# Altium footprint library PCB_GENERAL.PcbLib: 226 footprints (part 6 of 15)
Each footprint in its own frame and in the unit in brackets; x right, y up, seen from the top. Pads: shape width x height; smd on the part's side, far side on the other; paste and mask are expansions set on the pad; w line width, h text height; cw(c..) or ccw(c..) is an arc to the next point about the centre after c.
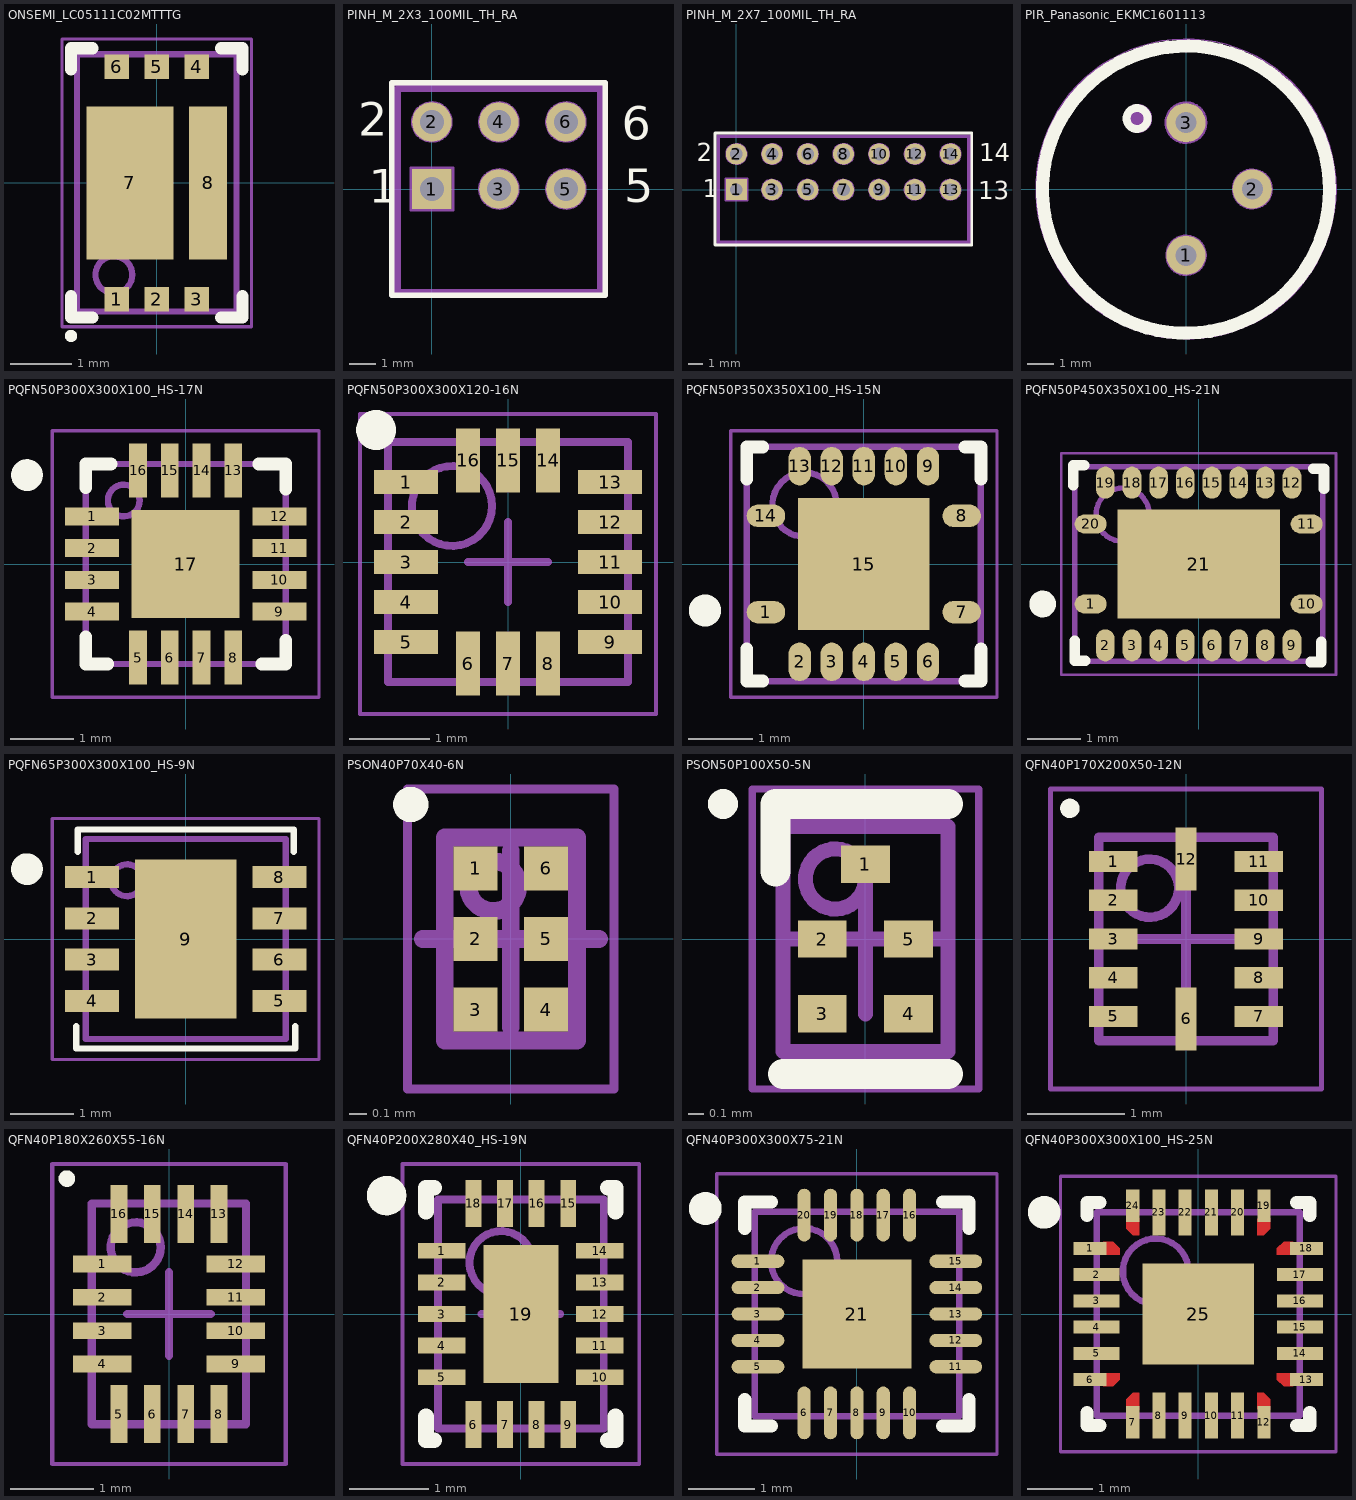
[diagram p5: the footprints below, top view; thin cyan lines are the x and y axes]

## ONSEMI_LC05111C02MTTTG [mm]
height 0.8
pads (8):
  rect 0.4x0.4 smd: 1(-0.65,-1.9) 2(0,-1.9) 3(0.65,-1.9) 4(0.65,1.9) 5(0,1.9) 6(-0.65,1.9)
  rect 1.42x2.5 smd: 7(-0.44,0)
  rect 0.62x2.5 smd: 8(0.84,0)
Top Overlay:
  circle w0.1: c-1.4,-2.5 r0.05
  lines w0.2: -1.4,-1.85 -1.4,-2.2 -1.05,-2.2 ; -1.4,1.85 -1.4,2.2 -1.05,2.2 ; 1.05,-2.2 1.4,-2.2 1.4,-1.85 ; 1.05,2.2 1.4,2.2 1.4,1.85
Mechanical 11:
  text ".Designator" at -0.75,-0.275 h1
Mechanical 14:
  circle w0.1: c-0.7,-1.5 r0.3
  lines w0.1: -1.3,-2.1 1.3,-2.1 1.3,2.1 -1.3,2.1 -1.3,-2.1
Mechanical 15:
  lines w0.05: -0.25,0 0.25,0 ; 0,-0.25 0,0.25 ; -1.55,-2.35 1.55,-2.35 1.55,2.35 -1.55,2.35 -1.55,-2.35
3D body: height 0.8, standoff 0.05, extent -1.3,-2.1 1.3,2.1

## PINH_M_2X3_100MIL_TH_RA [mm] "Connector; Header; Right Angle, 2x3 Position"
height 8
pads (6):
  rect 1.5x1.5 hole 0.9: 1(0,0)
  round 1.5 hole 0.9: 2(0,2.54) 3(2.54,0) 4(2.54,2.54) 5(5.08,0) 6(5.08,2.54)
Top Overlay:
  lines w0.2: -1.525,-4.025 6.575,-4.025 6.575,4.025 -1.525,4.025 -1.525,-4.025
  text "6" at 7.2,1.875 h1.27
  text "5" at 7.3,-0.5 h1.27
  text "1" at -2.4,-0.525 h1.27
  text "2" at -2.8,2.025 h1.27
Mechanical 11:
  text ".Designator" at -1.1,4.825 h1
Mechanical 14:
  circle w0.1: c5.08,0 r0.738
  circle w0.1: c2.54,0 r0.738
  circle w0.1: c5.08,2.54 r0.738
  circle w0.1: c0,2.54 r0.738
  circle w0.1: c2.54,2.54 r0.738
  lines w0.1: -0.8,-0.8 -0.8,0.8 0.8,0.8 0.8,-0.8 -0.8,-0.8
  lines w0.254: -1.3,-3.925 -1.3,3.8 6.38,3.8 6.38,-3.925 -1.3,-3.925
Mechanical 15:
  lines w0.05: -1.45,-4 -1.45,3.925 6.475,3.925 6.475,-4 -1.45,-4
3D body "12544.stp": height 5.5, standoff -3.25, extent -1.36,-9.6 6.26,2.855

## PINH_M_2X7_100MIL_TH_RA [mm] "Connector; Header; Right Angle; 2x7 Position"
height 8
pads (14):
  rect 1.5x1.5 hole 0.9: 1(0,0)
  round 1.5 hole 0.9: 2(0,2.54) 3(2.54,0) 4(2.54,2.54) 5(5.08,0) 6(5.08,2.54) 7(7.62,0) 8(7.62,2.54) 9(10.16,0) 10(10.16,2.54) 11(12.7,0) 12(12.7,2.54) 13(15.24,0) 14(15.24,2.54)
Top Overlay:
  lines w0.2: -1.525,-3.925 16.75,-3.925 16.75,4.025 -1.525,4.025 -1.525,-3.925
  text "14" at 17.275,2.025 h1.27
  text "13" at 17.225,-0.675 h1.27
  text "1" at -2.4,-0.525 h1.27
  text "2" at -2.8,2.025 h1.27
Mechanical 11:
  text ".Designator" at -1.1,4.825 h1
Mechanical 14:
  circle w0.1: c15.235,2.54 r0.738
  circle w0.1: c15.235,0 r0.738
  circle w0.1: c12.695,0 r0.738
  circle w0.1: c12.695,2.54 r0.738
  circle w0.1: c10.155,2.54 r0.738
  circle w0.1: c10.155,0 r0.738
  circle w0.1: c5.08,0 r0.738
  circle w0.1: c2.54,0 r0.738
  circle w0.1: c7.62,0 r0.738
  circle w0.1: c7.62,2.54 r0.738
  circle w0.1: c5.08,2.54 r0.738
  circle w0.1: c0,2.54 r0.738
  circle w0.1: c2.54,2.54 r0.738
  lines w0.1: -0.8,-0.8 -0.8,0.8 0.8,0.8 0.8,-0.8 -0.8,-0.8
  lines w0.254: -1.3,-3.725 -1.3,3.8 16.54,3.8 16.54,-3.725 -1.3,-3.725
Mechanical 15:
  lines w0.05: -1.45,-3.825 -1.45,3.925 16.7,3.925 16.7,-3.825 -1.45,-3.825
3D body "826662-7.stp": height 5.5, standoff -3.25, extent -1.29,-9.575 16.49,2.88

## PIR_Panasonic_EKMC1601113 [mm] "Passive InfraLED Motion Sensor"
height 14.4
pads (3):
  round 1.5 hole 0.8: 1(0,-2.54) 2(2.54,0) 3(0,2.54)
Top Overlay:
  circle w0.3: c-1.875,2.7 r0.401
  circle w0.5: c0,-0.025 r5.5
Mechanical 11:
  text ".Designator" at -4.325,6.675 h1
Mechanical 14:
  circle w0.1: c0,-2.54 r0.747
  circle w0.1: c2.54,0 r0.74
  circle w0.1: c0,2.54 r0.772
  circle w1: c-1.85,2.7 r0.05
  circle w0.1: c0,0 r5.5
Mechanical 15:
  circle w0.05: c0,0 r5.745
3D body: height 14.4, standoff 0, extent -5.468,-5.498 5.525,5.498

## PQFN50P300X300X100_HS-17N [mm] "PQFN, 16-Leads, Body 3,00x3,00mm, Pitch 0,50mm, Thermal Pad 1,60x2,50mm, IPC Medium Density"
height 1
pads (17):
  rect 0.85x0.28 smd: 1(-1.475,0.75) 2(-1.475,0.25) 3(-1.475,-0.25) 4(-1.475,-0.75) 9(1.475,-0.75) 10(1.475,-0.25) 11(1.475,0.25) 12(1.475,0.75)
  rect 0.28x0.85 smd: 5(-0.75,-1.475) 6(-0.25,-1.475) 7(0.25,-1.475) 8(0.75,-1.475) 13(0.75,1.475) 14(0.25,1.475) 15(-0.25,1.475) 16(-0.75,1.475)
  rect 1.7x1.7 smd: 17(0,0)
Top Overlay:
  circle w0.25: c-2.5,1.4 r0.125
  lines w0.2: -1.575,-1.15 -1.575,-1.575 -1.225,-1.575 ; -1.575,1.2 -1.575,1.575 -1.175,1.575 ; 1.15,1.575 1.575,1.575 1.575,1.175 ; 1.2,-1.575 1.575,-1.575 1.575,-1.2
Mechanical 11:
  text ".Designator" at -2.175,2.275 h1
Mechanical 14:
  circle w0.1: c-0.975,1 r0.25
  lines w0.1: -1.575,-1.575 1.575,-1.575 1.575,1.575 -1.575,1.575 -1.575,-1.575
Mechanical 15:
  lines w0.05: -2.1,-2.1 2.1,-2.1 2.1,2.1 -2.1,2.1 -2.1,-2.1
  lines w0.1: -0.5,0 0.5,0 ; 0,-0.5 0,0.5
3D body "User Library-QFN-16.step": height 0.9, standoff 0, extent -1.501,-1.501 1.501,1.501

## PQFN50P300X300X120-16N [mm] "PQFN, 16-Leads, Body 3,00x3,00mm, Pitch 0,50mm, IPC Medium Density"
height 1.2
pads (16):
  rect 0.8x0.3 smd: 1(-1.275,1) 2(-1.275,0.5) 3(-1.275,0) 4(-1.275,-0.5) 5(-1.275,-1) 9(1.275,-1) 10(1.275,-0.5) 11(1.275,0) 12(1.275,0.5) 13(1.275,1)
  rect 0.3x0.8 smd: 6(-0.5,-1.27) 7(0,-1.27) 8(0.5,-1.27) 14(0.5,1.27) 15(0,1.27) 16(-0.5,1.27)
Top Overlay:
  circle w0.25: c-1.65,1.65 r0.125
Mechanical 11:
  text ".Designator" at -0.875,-0.25 h1
Mechanical 14:
  circle w0.1: c-0.7,0.7 r0.5
  lines w0.1: -1.5,-1.5 -1.5,1.5 1.5,1.5 1.5,-1.5 -1.5,-1.5
Mechanical 15:
  lines w0.05: -1.85,-1.9 -1.85,1.85 1.85,1.85 1.85,-1.9 -1.85,-1.9
  lines w0.1: -0.5,0 0.5,0 ; 0,-0.5 0,0.5
3D body "PQFN50P300X300X120-16N.step": height 1.2, standoff 0, extent -1.55,-1.55 1.55,1.55

## PQFN50P350X350X100_HS-15N [mm] "PQFN, 14-Leads, Body 3,50x3,50mm, Pitch 0,50mm/1,50mm, Thermal Pad 2,05x2,05mm, IPC Medium Density"
height 1
pads (15):
  oval 0.6x0.35 smd: 1(-1.525,-0.75) 7(1.525,-0.75) 8(1.525,0.75) 14(-1.525,0.75)
  oval 0.35x0.6 smd: 2(-1,-1.525) 3(-0.5,-1.525) 4(0,-1.525) 5(0.5,-1.525) 6(1,-1.525) 9(1,1.525) 10(0.5,1.525) 11(0,1.525) 12(-0.5,1.525) 13(-1,1.525)
  rect 2.05x2.05 smd: 15(0,0)
Top Overlay:
  circle w0.25: c-2.475,-0.725 r0.125
  lines w0.2: -1.825,-1.325 -1.825,-1.825 -1.575,-1.825 ; -1.825,1.325 -1.825,1.825 -1.575,1.825 ; 1.575,-1.825 1.825,-1.825 1.825,-1.325 ; 1.575,1.825 1.825,1.825 1.825,1.325
Mechanical 11:
  text ".Designator" at -3.125,2.5 h1
Mechanical 14:
  circle w0.1: c-0.925,0.925 r0.5
  lines w0.1: -1.825,-1.825 -1.825,1.825 1.825,1.825 1.825,-1.825 -1.825,-1.825
Mechanical 15:
  lines w0.05: -2.075,-2.075 -2.075,2.075 2.075,2.075 2.075,-2.075 -2.075,-2.075
  lines w0.1: -0.5,0 0.5,0 ; 0,-0.5 0,0.5
3D body: height 1, standoff 0, extent -1.825,-1.825 1.825,1.825

## PQFN50P450X350X100_HS-21N [mm] "PQFN, 20-Leads, Body 4,50x3,50mm, Pitch 0,50mm/1,50mm, Thermal Pad 3,05x2,05mm, IPC Medium Density"
height 1
pads (21):
  oval 0.6x0.35 smd: 1(-2.025,-0.75) 10(2.025,-0.75) 11(2.025,0.75) 20(-2.025,0.75)
  oval 0.35x0.6 smd: 2(-1.75,-1.525) 3(-1.25,-1.525) 4(-0.75,-1.525) 5(-0.25,-1.525) 6(0.25,-1.525) 7(0.75,-1.525) 8(1.25,-1.525) 9(1.75,-1.525) 12(1.75,1.525) 13(1.25,1.525) 14(0.75,1.525) 15(0.25,1.525) 16(-0.25,1.525) 17(-0.75,1.525) 18(-1.25,1.525) 19(-1.75,1.525)
  rect 3.05x2.05 smd: 21(0,0)
Top Overlay:
  circle w0.25: c-2.925,-0.75 r0.125
  lines w0.2: -2.35,1.475 -2.35,1.85 -2.15,1.85 ; -2.325,-1.438 -2.325,-1.812 -2.125,-1.812 ; 2.1,-1.837 2.3,-1.837 2.3,-1.462 ; 2.15,1.787 2.35,1.787 2.35,1.412
Mechanical 11:
  text ".Designator" at -3.025,2.725 h1
Mechanical 14:
  circle w0.1: c-1.425,0.925 r0.5
  lines w0.1: -2.325,-1.825 -2.325,1.825 2.325,1.825 2.325,-1.825 -2.325,-1.825
Mechanical 15:
  lines w0.05: -2.575,-2.075 -2.575,2.075 2.575,2.075 2.575,-2.075 -2.575,-2.075
  lines w0.1: -0.5,0 0.5,0 ; 0,-0.5 0,0.5
3D body: height 1, standoff 0, extent -2.325,-1.825 2.325,1.825

## PQFN65P300X300X100_HS-9N [mm] "PQFN, 8-Leads, Body 3,00x3,00mm, Pitch 0,65mm, Thermal Pad 1,60x2,50mm, IPC Medium Density"
height 1
pads (9):
  rect 0.85x0.35 smd: 1(-1.475,0.975) 2(-1.475,0.325) 3(-1.475,-0.325) 4(-1.475,-0.975) 5(1.475,-0.975) 6(1.475,-0.325) 7(1.475,0.325) 8(1.475,0.975)
  rect 1.6x2.5 smd: 9(0,0)
Top Overlay:
  circle w0.25: c-2.5,1.1 r0.125
  lines w0.1: -1.725,-1.375 -1.725,-1.725 1.725,-1.725 1.725,-1.375 ; -1.7,1.375 -1.7,1.725 1.7,1.725 1.7,1.375
Mechanical 11:
  text ".Designator" at -1.4,2.25 h1
Mechanical 14:
  circle w0.1: c-0.925,0.925 r0.25
  lines w0.1: -1.575,-1.575 -1.575,1.575 1.575,1.575 1.575,-1.575 -1.575,-1.575
Mechanical 15:
  lines w0.05: -2.1,-1.9 -2.1,1.9 2.1,1.9 2.1,-1.9 -2.1,-1.9
  lines w0.1: -0.5,0 0.5,0 ; 0,-0.5 0,0.5
3D body: height 1, standoff 0, extent -1.575,-1.575 1.575,1.575

## PSON40P70X40-6N [mm] "PSON, 6-Leads, Body 1,10x0,70mm, Pitch 0,40mm, IPC Medium Density"
height 0.4
pads (6):
  rect 0.25x0.25 smd paste-1: 1(-0.2,0.4) 2(-0.2,0) 3(-0.2,-0.4) 4(0.2,-0.4) 5(0.2,0) 6(0.2,0.4)
Top Overlay:
  circle w0.1: c-0.567,0.762 r0.05
Top Paste:
  region: -0.325,-0.4 -0.325,-0.425 -0.306,-0.471 -0.271,-0.506 -0.225,-0.525 -0.2,-0.525 -0.175,-0.525 -0.129,-0.506 -0.094,-0.471 -0.075,-0.425 -0.075,-0.4 -0.075,-0.375 -0.094,-0.329 -0.129,-0.294 -0.175,-0.275 -0.2,-0.275 -0.225,-0.275 -0.271,-0.294 -0.306,-0.329 -0.325,-0.375
  region: 0.075,-0.4 0.075,-0.425 0.094,-0.471 0.129,-0.506 0.175,-0.525 0.2,-0.525 0.225,-0.525 0.271,-0.506 0.306,-0.471 0.325,-0.425 0.325,-0.4 0.325,-0.375 0.306,-0.329 0.271,-0.294 0.225,-0.275 0.2,-0.275 0.175,-0.275 0.129,-0.294 0.094,-0.329 0.075,-0.375
  region: 0.075,0 0.075,-0.025 0.094,-0.071 0.129,-0.106 0.175,-0.125 0.2,-0.125 0.225,-0.125 0.271,-0.106 0.306,-0.071 0.325,-0.025 0.325,0 0.325,0.025 0.306,0.071 0.271,0.106 0.225,0.125 0.2,0.125 0.175,0.125 0.129,0.106 0.094,0.071 0.075,0.025
  region: -0.2,-0.125 -0.225,-0.125 -0.271,-0.106 -0.306,-0.071 -0.325,-0.025 -0.325,0 -0.325,0.025 -0.306,0.071 -0.271,0.106 -0.225,0.125 -0.2,0.125 -0.175,0.125 -0.129,0.106 -0.094,0.071 -0.075,0.025 -0.075,0 -0.075,-0.025 -0.094,-0.071 -0.129,-0.106 -0.175,-0.125
  region: -0.2,0.275 -0.225,0.275 -0.271,0.294 -0.306,0.329 -0.325,0.375 -0.325,0.4 -0.325,0.425 -0.306,0.471 -0.271,0.506 -0.225,0.525 -0.2,0.525 -0.175,0.525 -0.129,0.506 -0.094,0.471 -0.075,0.425 -0.075,0.4 -0.075,0.375 -0.094,0.329 -0.129,0.294 -0.175,0.275
  region: 0.2,0.275 0.175,0.275 0.129,0.294 0.094,0.329 0.075,0.375 0.075,0.4 0.075,0.425 0.094,0.471 0.129,0.506 0.175,0.525 0.2,0.525 0.225,0.525 0.271,0.506 0.306,0.471 0.325,0.425 0.325,0.4 0.325,0.375 0.306,0.329 0.271,0.294 0.225,0.275
Mechanical 11:
  text ".Designator" at -0.4,-0.45 h1
Mechanical 14:
  circle w0.1: c-0.1,0.3 r0.141
  lines w0.1: -0.375,-0.575 0.375,-0.575 0.375,0.575 -0.375,0.575 -0.375,-0.575
Mechanical 15:
  lines w0.05: -0.585,-0.85 0.585,-0.85 0.585,0.85 -0.585,0.85 -0.585,-0.85
  lines w0.1: -0.5,0 0.5,0 ; 0,-0.5 0,0.5
3D body "PSON40P70X40-6N.step": height 0.4, standoff 0, extent -0.376,-0.575 0.376,0.575

## PSON50P100X50-5N [mm] "PSON, 5-Leads, Body 1,40x1,00mm, Pitch 0,50mm, IPC Medium Density"
height 0.5
pads (5):
  rect 0.325x0.25 smd: 1(0,0.5) 2(-0.288,0) 3(-0.288,-0.5) 4(0.288,-0.5) 5(0.288,0)
Top Overlay:
  circle w0.1: c-0.95,0.9 r0.05
  lines w0.2: -0.6,0.45 -0.6,0.9 0.55,0.9 ; -0.55,-0.9 0.55,-0.9
Mechanical 11:
  text ".Designator" at 0,-0.25 h1
Mechanical 14:
  circle w0.1: c-0.2,0.4 r0.2
  lines w0.1: -0.55,-0.75 -0.55,0.75 0.55,0.75 0.55,-0.75 -0.55,-0.75
Mechanical 15:
  lines w0.05: -0.755,-1 -0.755,1 0.755,1 0.755,-1 -0.755,-1
  lines w0.1: -0.5,0 0.5,0 ; 0,-0.5 0,0.5
3D body: height 0.5, standoff 0, extent -0.55,-0.75 0.55,0.75

## QFN40P170X200X50-12N [mm] "QFN, 12-Leads, Body 1,70x2,00mm, Pitch 0,40mm, IPC Medium Density"
height 0.5
pads (12):
  rect 0.5x0.22 smd: 1(-0.75,0.8) 2(-0.75,0.4) 3(-0.75,0) 4(-0.75,-0.4) 5(-0.75,-0.8) 7(0.75,-0.8) 8(0.75,-0.4) 9(0.75,0) 10(0.75,0.4) 11(0.75,0.8)
  rect 0.22x0.65 smd: 6(0,-0.825) 12(0,0.825)
Top Overlay:
  circle w0.1: c-1.2,1.35 r0.05
Mechanical 11:
  text ".Designator" at 0.1,-0.05 h1
Mechanical 14:
  circle w0.1: c-0.375,0.525 r0.3
  lines w0.1: -0.9,-1.05 -0.9,1.05 0.9,1.05 0.9,-1.05 -0.9,-1.05
Mechanical 15:
  lines w0.05: -1.4,-1.55 -1.4,1.55 1.4,1.55 1.4,-1.55 -1.4,-1.55
  lines w0.1: -0.5,0 0.5,0 ; 0,-0.5 0,0.5
3D body "QFN40P170X200X50-12N.step": height 0.5, standoff 0, extent -0.901,-1.051 0.901,1.051

## QFN40P180X260X55-16N [mm] "QFN, 16-Leads, Body 1,80x2,60mm, Pitch 0,40mm, IPC Medium Density"
height 0.55
pads (16):
  rect 0.7x0.2 smd: 1(-0.8,0.6) 2(-0.8,0.2) 3(-0.8,-0.2) 4(-0.8,-0.6) 9(0.8,-0.6) 10(0.8,-0.2) 11(0.8,0.2) 12(0.8,0.6)
  rect 0.2x0.7 smd: 5(-0.6,-1.2) 6(-0.2,-1.2) 7(0.2,-1.2) 8(0.6,-1.2) 13(0.6,1.2) 14(0.2,1.2) 15(-0.2,1.2) 16(-0.6,1.2)
Top Overlay:
  circle w0.1: c-1.225,1.625 r0.05
Mechanical 11:
  text ".Designator" at -1.05,-0.225 h1
Mechanical 14:
  circle w0.1: c-0.4,0.8 r0.3
  lines w0.1: -0.925,-1.325 -0.925,1.325 0.925,1.325 0.925,-1.325 -0.925,-1.325
Mechanical 15:
  lines w0.05: -1.4,-1.8 -1.4,1.8 1.4,1.8 1.4,-1.8 -1.4,-1.8
  lines w0.1: -0.5,0 0.5,0 ; 0,-0.5 0,0.5
3D body: height 0.55, standoff 0.05, extent -0.925,-1.325 0.925,1.325

## QFN40P200X280X40_HS-19N [mm] "QFN, 18-Leads, Body 2,00x2,80mm, Pitch 0,40mm, Thermal Pad 0,95x1,75mm, IPC Medium Density"
height 0.4
pads (19):
  rect 0.6x0.2 smd: 1(-1,0.8) 2(-1,0.4) 3(-1,0) 4(-1,-0.4) 5(-1,-0.8) 10(1,-0.8) 11(1,-0.4) 12(1,0) 13(1,0.4) 14(1,0.8)
  rect 0.2x0.6 smd: 6(-0.6,-1.4) 7(-0.2,-1.4) 8(0.2,-1.4) 9(0.6,-1.4) 15(0.6,1.4) 16(0.2,1.4) 17(-0.2,1.4) 18(-0.6,1.4)
  rect 0.95x1.75 smd: 19(0,0)
Top Overlay:
  circle w0.25: c-1.7,1.5 r0.125
  lines w0.2: -1.2,-1.3 -1.2,-1.6 -1.1,-1.6 ; -1.2,1.3 -1.2,1.6 -1.1,1.6 ; 1.1,-1.6 1.2,-1.6 1.2,-1.3 ; 1.1,1.6 1.2,1.6 1.2,1.3
Mechanical 11:
  text ".Designator" at -1.1,-0.5 h1
Mechanical 14:
  circle w0.1: c-0.25,0.65 r0.4
  lines w0.1: -1.05,-1.45 1.05,-1.45 1.05,1.45 -1.05,1.45 -1.05,-1.45
Mechanical 15:
  lines w0.05: -1.5,-1.9 1.5,-1.9 1.5,1.9 -1.5,1.9 -1.5,-1.9
  lines w0.1: -0.5,0 0.5,0 ; 0,-0.5 0,0.5
3D body "QFN40P200X280X40_HS-19N.step": height 0.4, standoff 0, extent -1.051,-1.451 1.051,1.451

## QFN40P300X300X75-21N [mm] "QFN, 21-Leads, Body 3,00x3,00mm, Pitch 0,4mm, IPC Medium Density"
height 0.75
pads (21):
  oval 0.8x0.2 smd: 1(-1.5,0.8) 2(-1.5,0.4) 3(-1.5,0) 4(-1.5,-0.4) 5(-1.5,-0.8) 11(1.5,-0.8) 12(1.5,-0.4) 13(1.5,0) 14(1.5,0.4) 15(1.5,0.8)
  oval 0.2x0.8 smd: 6(-0.8,-1.5) 7(-0.4,-1.5) 8(0,-1.5) 9(0.4,-1.5) 10(0.8,-1.5) 16(0.8,1.5) 17(0.4,1.5) 18(0,1.5) 19(-0.4,1.5) 20(-0.8,1.5)
  rect 1.65x1.65 smd: 21(0,0)
Top Overlay:
  circle w0.25: c-2.3,1.6 r0.125
  lines w0.2: -1.7,-1.3 -1.7,-1.7 -1.3,-1.7 ; -1.7,1.3 -1.7,1.7 -1.3,1.7 ; 1.3,-1.7 1.7,-1.7 1.7,-1.3 ; 1.3,1.7 1.7,1.7 1.7,1.3
Mechanical 11:
  text ".Designator" at -1.1,-0.3 h1
Mechanical 14:
  circle w0.1: c-0.8,0.8 r0.5
  lines w0.1: -1.55,-1.55 1.55,-1.55 1.55,1.55 -1.55,1.55 -1.55,-1.55
Mechanical 15:
  lines w0.05: -2.125,-2.125 2.125,-2.125 2.125,2.125 -2.125,2.125 -2.125,-2.125
  lines w0.1: -0.5,0 0.5,0 ; 0,-0.5 0,0.5
3D body: height 0.8, standoff 0, extent -1.55,-1.55 1.55,1.55

## QFN40P300X300X100_HS-25N [mm] "QFN, 24-Leads, Body 3,00x3,00mm, Pitch 0,40mm, Thermal Pad 1,70x1,54mm, IPC Medium Density"
height 1
pads (25):
  rect 0.5x0.2 smd: 1(-1.65,1) 6(-1.65,-1) 13(1.65,-1) 18(1.65,1)
  rect 0.7x0.2 smd: 2(-1.55,0.6) 3(-1.55,0.2) 4(-1.55,-0.2) 5(-1.55,-0.6) 14(1.55,-0.6) 15(1.55,-0.2) 16(1.55,0.2) 17(1.55,0.6)
  rect 0.2x0.5 smd: 7(-1,-1.65) 12(1,-1.65) 19(1,1.65) 24(-1,1.65)
  rect 0.2x0.7 smd: 8(-0.6,-1.55) 9(-0.2,-1.55) 10(0.2,-1.55) 11(0.6,-1.55) 20(0.6,1.55) 21(0.2,1.55) 22(-0.2,1.55) 23(-0.6,1.55)
  rect 1.7x1.54 smd: 25(0,0)
Top Layer:
  region: 1.1,1.45 1.1,1.3 1,1.2 0.9,1.2 0.9,1.45
  region: 1.45,1.1 1.3,1.1 1.2,1 1.2,0.9 1.45,0.9
  region: 1.45,-1.1 1.3,-1.1 1.2,-1 1.2,-0.9 1.45,-0.9
  region: 1.1,-1.45 1.1,-1.3 1,-1.2 0.9,-1.2 0.9,-1.45
  region: -1.1,-1.45 -1.1,-1.3 -1,-1.2 -0.9,-1.2 -0.9,-1.45
  region: -1.45,-1.1 -1.3,-1.1 -1.2,-1 -1.2,-0.9 -1.45,-0.9
  region: -1.1,1.45 -1.1,1.3 -1,1.2 -0.9,1.2 -0.9,1.45
  region: -1.45,1.1 -1.3,1.1 -1.2,1 -1.2,0.9 -1.45,0.9
Top Overlay:
  circle w0.25: c-2.35,1.55 r0.125
  lines w0.2: -1.7,-1.5 -1.7,-1.7 -1.5,-1.7 ; -1.7,1.5 -1.7,1.7 -1.5,1.7 ; 1.5,-1.7 1.7,-1.7 1.7,-1.5 ; 1.5,1.7 1.7,1.7 1.7,1.5
Top Paste:
  region: 1.45,1.1 1.3,1.1 1.2,1 1.2,0.9 1.45,0.9
  region: 1.1,1.45 1.1,1.3 1,1.2 0.9,1.2 0.9,1.45
  region: -1.45,1.1 -1.3,1.1 -1.2,1 -1.2,0.9 -1.45,0.9
  region: -1.1,-1.45 -1.1,-1.3 -1,-1.2 -0.9,-1.2 -0.9,-1.45
  region: 1.45,-1.1 1.3,-1.1 1.2,-1 1.2,-0.9 1.45,-0.9
  region: 1.1,-1.45 1.1,-1.3 1,-1.2 0.9,-1.2 0.9,-1.45
  region: -1.45,-1.1 -1.3,-1.1 -1.2,-1 -1.2,-0.9 -1.45,-0.9
  region: -1.1,1.45 -1.1,1.3 -1,1.2 -0.9,1.2 -0.9,1.45
Top Solder:
  region: 1.2,1.35 1.2,1.3 1,1.1 0.8,1.1 0.8,1.35
  region: 1.35,1.2 1.3,1.2 1.1,1 1.1,0.8 1.35,0.8
  region: 1.35,-1.2 1.3,-1.2 1.1,-1 1.1,-0.8 1.35,-0.8
  region: 1.2,-1.35 1.2,-1.3 1,-1.1 0.8,-1.1 0.8,-1.35
  region: -1.2,-1.35 -1.2,-1.3 -1,-1.1 -0.8,-1.1 -0.8,-1.35
  region: -1.35,-1.2 -1.3,-1.2 -1.1,-1 -1.1,-0.8 -1.35,-0.8
  region: -1.2,1.35 -1.2,1.3 -1,1.1 -0.8,1.1 -0.8,1.35
  region: -1.35,1.2 -1.3,1.2 -1.1,1 -1.1,0.8 -1.35,0.8
Mechanical 11:
  text ".Designator" at -0.2,-0.3 h1
Mechanical 14:
  circle w0.1: c-0.65,0.65 r0.5
  lines w0.1: -1.55,-1.55 1.55,-1.55 1.55,1.55 -1.55,1.55 -1.55,-1.55
Mechanical 15:
  lines w0.05: -2.1,-2.1 2.1,-2.1 2.1,2.1 -2.1,2.1 -2.1,-2.1
  lines w0.1: -0.5,0 0.5,0 ; 0,-0.5 0,0.5
3D body "QFN40P300X300X100_HS-25N.step": height 1, standoff 0, extent -1.551,-1.551 1.551,1.551